# Altium footprint library Custom1.PcbLib: 554 footprints (part 17 of 35)
Each footprint in its own frame and in the unit in brackets; x right, y up, seen from the top. Pads: shape width x height; smd on the part's side, far side on the other; paste and mask are expansions set on the pad; w line width, h text height; cw(c..) or ccw(c..) is an arc to the next point about the centre after c.
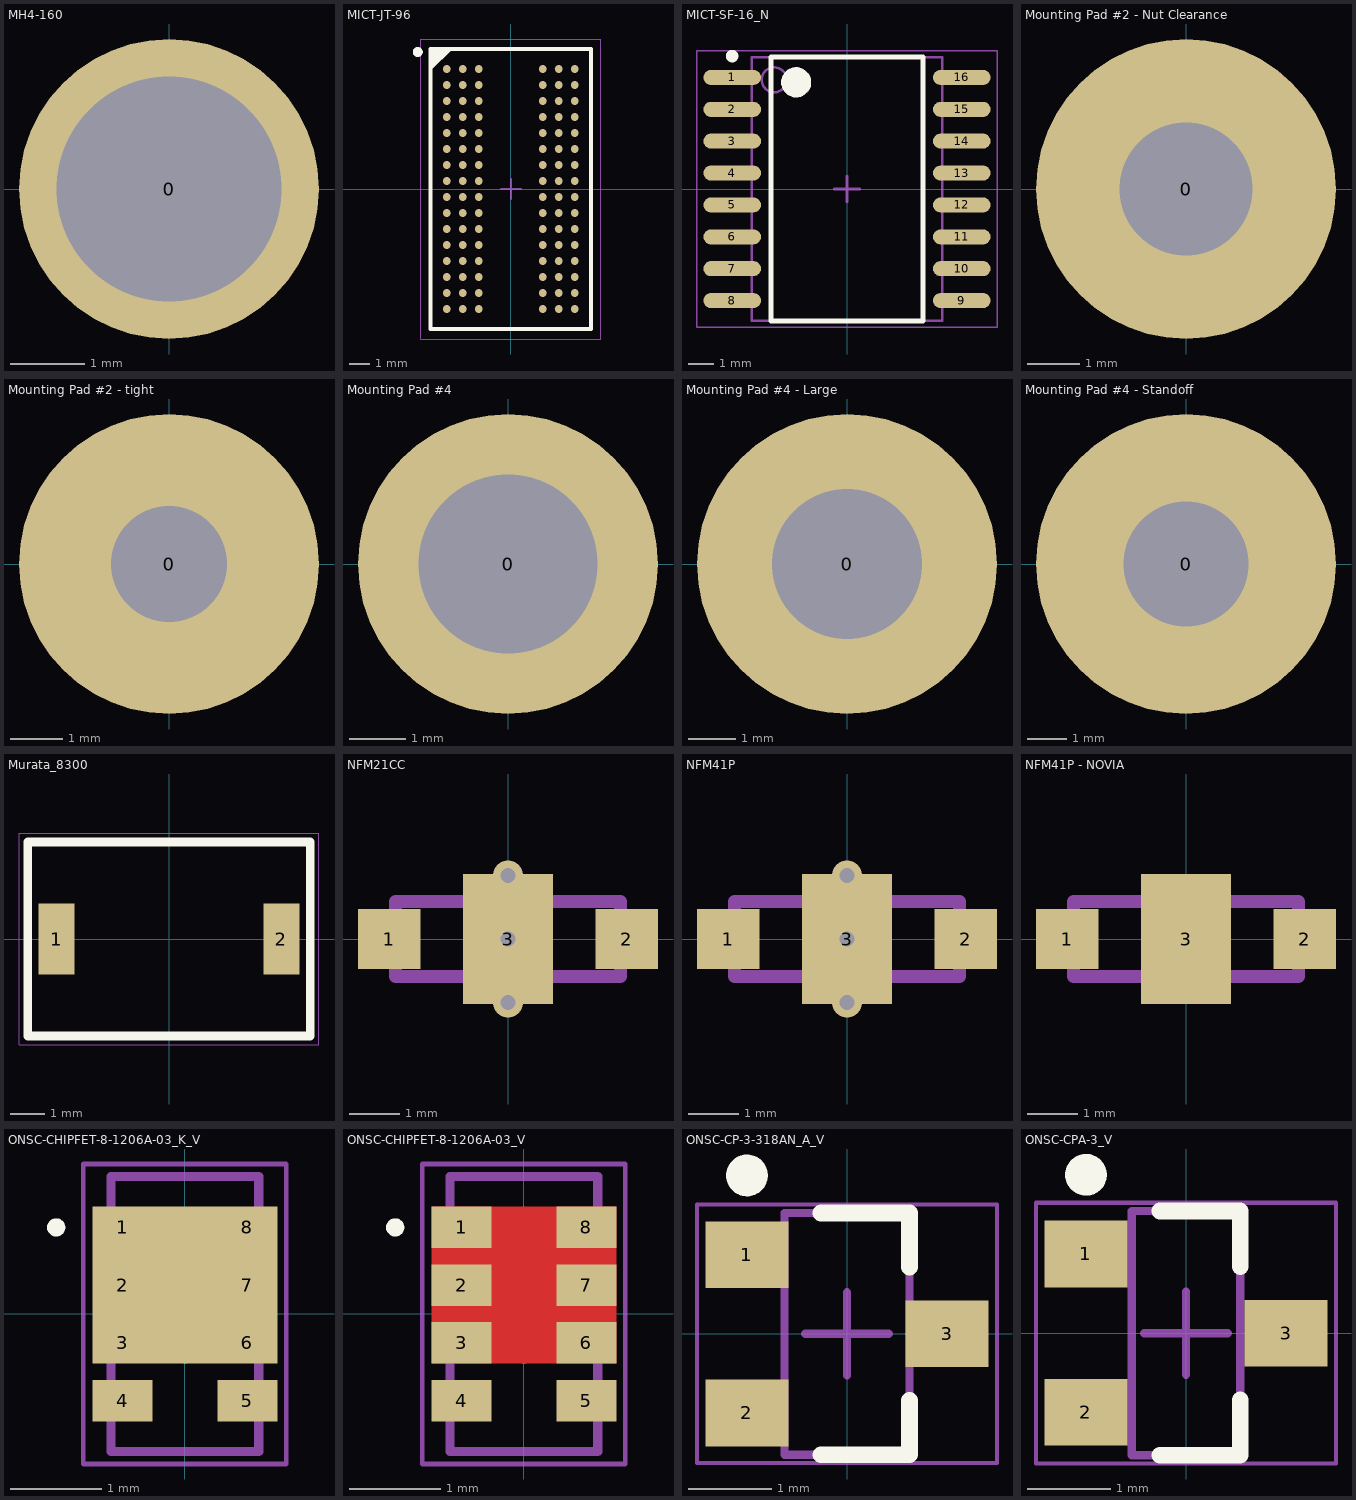
[diagram p16: the footprints below, top view; thin cyan lines are the x and y axes]

## MH4-160 [mil]
pads (1):
  round 160 hole 120: 0(0,0)

## MICT-JT-96 [mm] "BGA, 96-Balls, Body 14x8mm, Pitch 0.8mm"
pads (96):
  round 0.4 smd: A1(-3.2,6) A2(-2.4,6) A3(-1.6,6) A7(1.6,6) A8(2.4,6) A9(3.2,6) B1(-3.2,5.2) B2(-2.4,5.2) B3(-1.6,5.2) B7(1.6,5.2) B8(2.4,5.2) B9(3.2,5.2) C1(-3.2,4.4) C2(-2.4,4.4) C3(-1.6,4.4) C7(1.6,4.4) C8(2.4,4.4) C9(3.2,4.4) D1(-3.2,3.6) D2(-2.4,3.6) D3(-1.6,3.6) D7(1.6,3.6) D8(2.4,3.6) D9(3.2,3.6) E1(-3.2,2.8) E2(-2.4,2.8) E3(-1.6,2.8) E7(1.6,2.8) E8(2.4,2.8) E9(3.2,2.8) F1(-3.2,2) F2(-2.4,2) F3(-1.6,2) F7(1.6,2) F8(2.4,2) F9(3.2,2) G1(-3.2,1.2) G2(-2.4,1.2) G3(-1.6,1.2) G7(1.6,1.2) G8(2.4,1.2) G9(3.2,1.2) H1(-3.2,0.4) H2(-2.4,0.4) H3(-1.6,0.4) H7(1.6,0.4) H8(2.4,0.4) H9(3.2,0.4) J1(-3.2,-0.4) J2(-2.4,-0.4) J3(-1.6,-0.4) J7(1.6,-0.4) J8(2.4,-0.4) J9(3.2,-0.4) K1(-3.2,-1.2) K2(-2.4,-1.2) K3(-1.6,-1.2) K7(1.6,-1.2) K8(2.4,-1.2) K9(3.2,-1.2) L1(-3.2,-2) L2(-2.4,-2) L3(-1.6,-2) L7(1.6,-2) L8(2.4,-2) L9(3.2,-2) M1(-3.2,-2.8) M2(-2.4,-2.8) M3(-1.6,-2.8) M7(1.6,-2.8) M8(2.4,-2.8) M9(3.2,-2.8) N1(-3.2,-3.6) N2(-2.4,-3.6) N3(-1.6,-3.6) N7(1.6,-3.6) N8(2.4,-3.6) N9(3.2,-3.6) P1(-3.2,-4.4) P2(-2.4,-4.4) P3(-1.6,-4.4) P7(1.6,-4.4) P8(2.4,-4.4) P9(3.2,-4.4) R1(-3.2,-5.2) R2(-2.4,-5.2) R3(-1.6,-5.2) R7(1.6,-5.2) R8(2.4,-5.2) R9(3.2,-5.2) T1(-3.2,-6) T2(-2.4,-6) T3(-1.6,-6) T7(1.6,-6) T8(2.4,-6) T9(3.2,-6)
Top Overlay:
  circle w0.25: c-4.65,6.85 r0.125
  region: -3.049,7 -4,6.049 -4,7
  lines w0.2: -4,6.049 -3.049,7 ; -4,-7 -4,7 4,7 4,-7 -4,-7
Mechanical 13:
  lines w0.1: -4,-7 -4,7 4,7 4,-7 -4,-7
Mechanical 15:
  lines w0.05: -4.5,-7.5 -4.5,7.5 4.5,7.5 4.5,-7.5 -4.5,-7.5
  lines w0.1: -0.5,0 0.5,0 ; 0,-0.5 0,0.5
3D body: height 0.25, standoff 0, extent -4,-7 4,7

## MICT-SF-16_N [mm] "SOIC, 16-Leads, Body 10.3x7.5mm, Pitch 1.27mm, IPC Medium Density"
pads (16):
  oval 2.3x0.6 smd: 1(-4.575,4.445) 2(-4.575,3.175) 3(-4.575,1.905) 4(-4.575,0.635) 5(-4.575,-0.635) 6(-4.575,-1.905) 7(-4.575,-3.175) 8(-4.575,-4.445) 9(4.575,-4.445) 10(4.575,-3.175) 11(4.575,-1.905) 12(4.575,-0.635) 13(4.575,0.635) 14(4.575,1.905) 15(4.575,3.175) 16(4.575,4.445)
Top Overlay:
  circle w0.25: c-4.575,5.295 r0.125
  circle w0.6: c-2.025,4.25 r0.3
  lines w0.2: -3.025,-5.25 -3.025,5.25 3.025,5.25 3.025,-5.25 -3.025,-5.25
Mechanical 13:
  circle w0.1: c-2.9,4.35 r0.5
  lines w0.1: -3.8,-5.25 -3.8,5.25 3.8,5.25 3.8,-5.25 -3.8,-5.25
Mechanical 15:
  lines w0.05: -5.975,-5.5 -5.975,5.5 5.975,5.5 5.975,-5.5 -5.975,-5.5
  lines w0.1: -0.5,0 0.5,0 ; 0,-0.5 0,0.5
3D body: height 0.1, standoff 0, extent -3.8,-5.25 3.8,5.25

## Mounting Pad #2 - Nut Clearance [mm]
pads (1):
  round 5.715 / inner round 3.048 / far side round 5.715 hole 2.54 paste-3.175: 0(0,0)

## Mounting Pad #2 - tight [mil]
pads (1):
  round 225 / inner round 120 / far side round 225 hole 87 paste-125: 0(0,0)

## Mounting Pad #4 [mil]
pads (1):
  round 210 hole 125 paste-125: 0(0,0)

## Mounting Pad #4 - Large [mm]
pads (1):
  round 6.35 / inner round 5.08 / far side round 6.35 hole 3.175 paste-3.175: 0(0,0)

## Mounting Pad #4 - Standoff [mm]
pads (1):
  round 7.62 / inner round 5.08 / far side round 7.62 hole 3.175 paste-3.175: 0(0,0)

## Murata_8300 [mil]
pads (2):
  rect 41x80 smd: 1(-127.5,0) 2(127.5,0)
Top Overlay:
  lines w10: -160,-110 -160,58 -160,110 160,110 160,-110 -160,-110
Mechanical 15:
  lines w1: -170,-120 -170,120 170,120 170,-120 -170,-120
3D body: height 71, standoff 0, extent -110,-110 110,110

## NFM21CC [mm]
height 1
pads (3):
  rect 1.25x1.2 smd: 1(-2.375,0) 2(2.375,0)
  rect 1.8x2.6 smd paste-1.524: 3(0,0)
via 0,-1.27 diameter 0.61 hole 0.305
via 0,1.27 diameter 0.61 hole 0.305
via 0,0 diameter 0.61 hole 0.305
Top Paste:
  rectangle: 0.375,-0.4 0.8,0.4
  rectangle: -0.8,-0.4 -0.375,0.4
  rectangle: -0.875,-1.025 0.875,-0.225
  rectangle: -0.875,0.25 0.875,1.05
Mechanical 15:
  lines w0.254: -2.25,-0.75 2.25,-0.75 2.25,0.75 -2.25,0.75 -2.25,-0.75
3D body: height 1.3, standoff 0, extent -2.25,-0.508 2.25,0.5

## NFM41P [mm]
height 1
pads (3):
  rect 1.25x1.2 smd: 1(-2.375,0) 2(2.375,0)
  rect 1.8x2.6 smd paste-1.524: 3(0,0)
via 0,-1.27 diameter 0.61 hole 0.305
via 0,1.27 diameter 0.61 hole 0.305
via 0,0 diameter 0.61 hole 0.305
Top Paste:
  rectangle: 0.375,-0.4 0.8,0.4
  rectangle: -0.8,-0.4 -0.375,0.4
  rectangle: -0.875,-1.025 0.875,-0.225
  rectangle: -0.875,0.25 0.875,1.05
Mechanical 15:
  lines w0.254: -2.25,-0.75 2.25,-0.75 2.25,0.75 -2.25,0.75 -2.25,-0.75
3D body: height 1.3, standoff 0, extent -2.25,-0.508 2.25,0.5

## NFM41P - NOVIA [mm]
height 1
pads (3):
  rect 1.25x1.2 smd: 1(-2.375,0) 2(2.375,0)
  rect 1.8x2.6 smd: 3(0,0)
Mechanical 15:
  lines w0.254: -2.25,-0.75 2.25,-0.75 2.25,0.75 -2.25,0.75 -2.25,-0.75
3D body: height 1.3, standoff 0, extent -2.25,-0.508 2.25,0.5

## ONSC-CHIPFET-8-1206A-03_K_V [mil] "SON, 8-Leads, Body 3.026x1.626mm, Pitch 0.65mm"
height 43.31
pads (9):
  rect 25.98x17.99 smd: 1(-27.01,37.5) 2(-27.01,12.5) 3(-27.01,-12.5) 4(-27.01,-37.5) 5(27.01,-37.5) 6(27.01,-12.5) 7(27.01,12.5) 8(27.01,37.5)
  rect 80x67.99 smd: ""(0,12.5)
Top Overlay:
  circle w3.94: c-55.75,37.5 r1.97
Mechanical 13:
  lines w3.94: -31.99,-59.55 31.99,-59.55 31.99,59.57 -31.99,59.57 -31.99,-59.55
Mechanical 15:
  lines w1.97: -43.94,-64.96 43.94,-64.96 43.94,64.96 -43.94,64.96 -43.94,-64.96
  lines w3.94: -19.68,0 19.69,0 ; 0,-19.69 0,19.68
3D body: height 43.31, standoff 0, extent -31.99,-59.55 31.99,59.55

## ONSC-CHIPFET-8-1206A-03_V [mm] "SON, 8-Leads, Body 3.026x1.626mm, Pitch 0.635mm"
height 1.1
pads (8):
  rect 0.66x0.457 smd: 1(-0.686,0.953) 2(-0.686,0.318) 3(-0.686,-0.318) 4(-0.686,-0.953) 5(0.686,-0.953) 6(0.686,-0.318) 7(0.686,0.318) 8(0.686,0.953)
Top Layer:
  rectangle: -1.016,-0.546 1.016,1.181
Top Overlay:
  circle w0.1: c-1.416,0.953 r0.05
Mechanical 13:
  lines w0.1: -0.812,-1.513 0.813,-1.513 0.813,1.513 -0.812,1.513 -0.812,-1.513
Mechanical 15:
  lines w0.05: -1.116,-1.65 1.116,-1.65 1.116,1.65 -1.116,1.65 -1.116,-1.65
  lines w0.1: -0.5,0 0.5,0 ; 0,-0.5 0,0.5
3D body: height 1.1, standoff 0, extent -0.812,-1.513 0.813,1.512

## ONSC-CP-3-318AN_A_V [mm] "SOT23, 3-Leads, Body 2.9x1.5mm, Pitch 0.95mm"
height 1.308
pads (3):
  rect 1x0.8 smd: 1(-1.2,0.95) 2(-1.2,-0.95) 3(1.2,0)
Top Overlay:
  circle w0.25: c-1.2,1.9 r0.125
  lines w0.2: -0.313,-1.45 0.75,-1.45 0.75,-0.8 ; -0.313,1.45 0.75,1.45 0.75,0.8
Mechanical 13:
  lines w0.1: -0.75,-1.45 -0.75,1.45 0.75,1.45 0.75,-1.45 -0.75,-1.45
Mechanical 15:
  lines w0.05: -1.8,-1.55 -1.8,1.55 1.8,1.55 1.8,-1.55 -1.8,-1.55
  lines w0.1: -0.5,0 0.5,0 ; 0,-0.5 0,0.5
3D body: height 1.31, standoff 0, extent -0.75,-1.45 0.75,1.45

## ONSC-CPA-3_V [mm] "SOT23, 3-Leads, Body 2.93x1.3mm, Pitch 0.95mm"
height 1.3
pads (3):
  rect 1x0.8 smd: 1(-1.2,0.95) 2(-1.2,-0.95) 3(1.2,0)
Top Overlay:
  circle w0.25: c-1.2,1.9 r0.125
  lines w0.2: -0.317,-1.465 0.65,-1.465 0.65,-0.797 ; -0.317,1.465 0.65,1.465 0.65,0.797
Mechanical 13:
  lines w0.1: -0.65,-1.465 -0.65,1.465 0.65,1.465 0.65,-1.465 -0.65,-1.465
Mechanical 15:
  lines w0.05: -1.8,-1.565 1.8,-1.565 1.8,1.565 -1.8,1.565 -1.8,-1.565
  lines w0.1: -0.5,0 0.5,0 ; 0,-0.5 0,0.5
3D body: height 1.3, standoff 0, extent -0.65,-1.465 0.65,1.465